# Altium footprint library PowerProducts.PCBLIB: 166 footprints (part 10 of 11)
Each footprint in its own frame and in the unit in brackets; x right, y up, seen from the top. Pads: shape width x height; smd on the part's side, far side on the other; paste and mask are expansions set on the pad; w line width, h text height; cw(c..) or ccw(c..) is an arc to the next point about the centre after c.
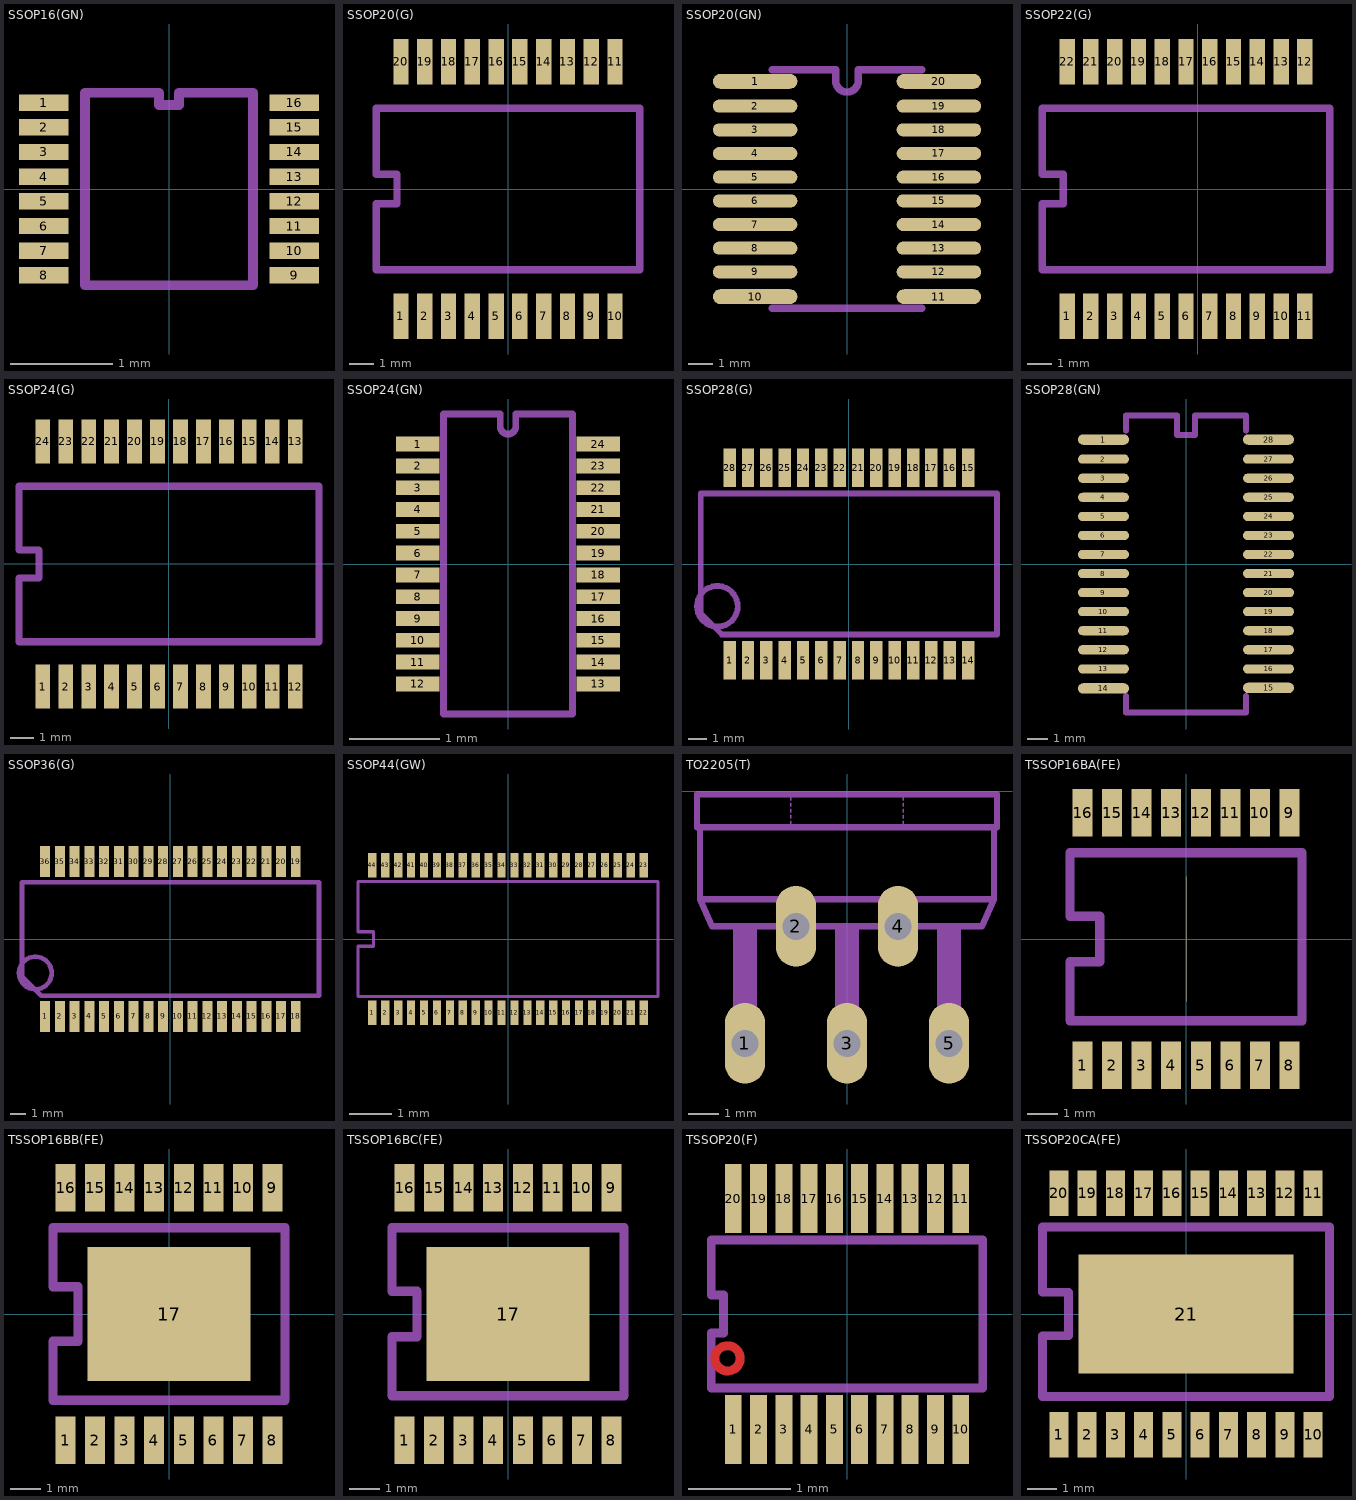
[diagram p9: the footprints below, top view; thin cyan lines are the x and y axes]

## SSOP16(GN) [mil]
pads (16):
  rect 19.05x6.29 smd: 1(-48.39,33.34) 2(-48.39,23.81) 3(-48.39,14.29) 4(-48.39,4.76) 5(-48.39,-4.76) 6(-48.39,-14.29) 7(-48.39,-23.81) 8(-48.39,-33.34) 9(48.39,-33.34) 10(48.39,-23.81) 11(48.39,-14.29) 12(48.39,-4.76) 13(48.39,4.76) 14(48.39,14.29) 15(48.39,23.81) 16(48.39,33.34)
Mechanical 2:
  lines w3.81: -32.38,-37.15 32.38,-37.15 32.38,37.15 3.91,37.15 3.91,32.5 -3.91,32.5 -3.91,37.15 -32.38,37.15 -32.38,-37.15

## SSOP20(G) [mil]
pads (20):
  rect 24.8x73.82 smd: 1(-172.74,-205.22) 2(-134.35,-205.22) 3(-95.96,-205.22) 4(-57.58,-205.22) 5(-19.19,-205.22) 6(19.19,-205.22) 7(57.58,-205.22) 8(95.96,-205.22) 9(134.35,-205.22) 10(172.74,-205.22) 11(172.74,205.22) 12(134.35,205.22) 13(95.96,205.22) 14(57.58,205.22) 15(19.19,205.22) 16(-19.19,205.22) 17(-57.58,205.22) 18(-95.96,205.22) 19(-134.35,205.22) 20(-172.74,205.22)
Mechanical 2:
  lines w12: -212.6,-130.22 -212.6,-23.62 -179.16,-23.62 -179.16,23.62 -212.6,23.62 -212.6,130.22 212.6,130.22 212.6,-130.22 -212.6,-130.22

## SSOP20(GN) [mm]
pads (20):
  rrect100% 3.405x0.6 smd: 1(-3.696,4.331) 10(-3.696,-4.331) 11(3.696,-4.331) 20(3.696,4.331)
  rrect100% 3.405x0.525 smd: 2(-3.696,3.334) 3(-3.696,2.381) 4(-3.696,1.429) 5(-3.696,0.476) 6(-3.696,-0.476) 7(-3.696,-1.429) 8(-3.696,-2.381) 9(-3.696,-3.334) 12(3.696,-3.334) 13(3.696,-2.381) 14(3.696,-1.429) 15(3.696,-0.476) 16(3.696,0.476) 17(3.696,1.429) 18(3.696,2.381) 19(3.696,3.334)
Mechanical 2:
  lines w0.3: -3,-4.8 3,-4.8 ; -3,4.8 -0.45,4.8 -0.45,4.35 ccw(c0,4.35) 0.45,4.35 0.45,4.8 3,4.8

## SSOP22(G) [mil]
pads (22):
  rect 24.8x73.82 smd: 1(-211.12,-205.22) 2(-172.74,-205.22) 3(-134.35,-205.22) 4(-95.96,-205.22) 5(-57.58,-205.22) 6(-19.19,-205.22) 7(19.19,-205.22) 8(57.58,-205.22) 9(95.96,-205.22) 10(134.35,-205.22) 11(172.74,-205.22) 12(172.74,205.22) 13(134.35,205.22) 14(95.96,205.22) 15(57.58,205.22) 16(19.19,205.22) 17(-19.19,205.22) 18(-57.58,205.22) 19(-95.96,205.22) 20(-134.35,205.22) 21(-172.74,205.22) 22(-211.12,205.22)
Mechanical 2:
  lines w12: -250.98,-130.22 -250.98,-23.62 -217.54,-23.62 -217.54,23.62 -250.98,23.62 -250.98,130.22 212.6,130.22 212.6,-130.22 -250.98,-130.22

## SSOP24(G) [mil]
pads (24):
  rect 24.8x73.82 smd: 1(-211.12,-205.22) 2(-172.74,-205.22) 3(-134.35,-205.22) 4(-95.96,-205.22) 5(-57.58,-205.22) 6(-19.19,-205.22) 7(19.19,-205.22) 8(57.58,-205.22) 9(95.96,-205.22) 10(134.35,-205.22) 11(172.74,-205.22) 12(211.12,-205.22) 13(211.12,205.22) 14(172.74,205.22) 15(134.35,205.22) 16(95.96,205.22) 17(57.58,205.22) 18(19.19,205.22) 19(-19.19,205.22) 20(-57.58,205.22) 21(-95.96,205.22) 22(-134.35,205.22) 23(-172.74,205.22) 24(-211.12,205.22)
Mechanical 2:
  lines w12: -250.98,-130.22 -250.98,-23.62 -217.54,-23.62 -217.54,23.62 -250.98,23.62 -250.98,130.22 250.98,130.22 250.98,-130.22 -250.98,-130.22

## SSOP24(GN) [mil]
pads (24):
  rect 19.05x6.48 smd: 1(-39.43,52.39) 2(-39.43,42.86) 3(-39.43,33.34) 4(-39.43,23.81) 5(-39.43,14.29) 6(-39.43,4.76) 7(-39.43,-4.76) 8(-39.43,-14.29) 9(-39.43,-23.81) 10(-39.43,-33.34) 11(-39.43,-42.86) 12(-39.43,-52.39) 13(39.43,-52.39) 14(39.43,-42.86) 15(39.43,-33.34) 16(39.43,-23.81) 17(39.43,-14.29) 18(39.43,-4.76) 19(39.43,4.76) 20(39.43,14.29) 21(39.43,23.81) 22(39.43,33.34) 23(39.43,42.86) 24(39.43,52.39)
Mechanical 2:
  lines w3: -28.19,-65.53 28.19,-65.53 28.19,65.53 3.41,65.53 3.41,60.28 cw(c0,60.17) -3.41,60.28 -3.41,65.53 -28.19,65.53 -28.19,-65.53

## SSOP28(G) [mil]
pads (28):
  rect 25.98x80.91 smd: 1(-249.51,-201.67) 2(-211.12,-201.67) 3(-172.74,-201.67) 4(-134.35,-201.67) 5(-95.96,-201.67) 6(-57.58,-201.67) 7(-19.19,-201.67) 8(19.19,-201.67) 9(57.58,-201.67) 10(95.96,-201.67) 11(134.35,-201.67) 12(172.74,-201.67) 13(211.12,-201.67) 14(249.51,-201.67) 15(249.51,201.67) 16(211.12,201.67) 17(172.74,201.67) 18(134.35,201.67) 19(95.96,201.67) 20(57.58,201.67) 21(19.19,201.67) 22(-19.19,201.67) 23(-57.58,201.67) 24(-95.96,201.67) 25(-134.35,201.67) 26(-172.74,201.67) 27(-211.12,201.67) 28(-249.51,201.67)
Mechanical 2:
  circle w12: c-275.23,-88.58 r42.59
  lines w12: -310.04,-103.35 -310.04,147.64 310.04,147.64 310.04,-147.64 -265.75,-147.64 -310.04,-103.35

## SSOP28(GN) [mm]
pads (28):
  rrect100% 2.55x0.525 smd: 1(-4.123,6.221) 14(-4.123,-6.221) 15(4.123,-6.191) 28(4.123,6.221)
  rrect100% 2.55x0.457 smd: 2(-4.123,5.239) 3(-4.123,4.286) 4(-4.123,3.334) 5(-4.123,2.381) 6(-4.123,1.429) 7(-4.123,0.476) 8(-4.123,-0.476) 9(-4.123,-1.429) 10(-4.123,-2.381) 11(-4.123,-3.334) 12(-4.123,-4.286) 13(-4.123,-5.239) 16(4.123,-5.239) 17(4.123,-4.286) 18(4.123,-3.334) 19(4.123,-2.381) 20(4.123,-1.429) 21(4.123,-0.476) 22(4.123,0.476) 23(4.123,1.429) 24(4.123,2.381) 25(4.123,3.334) 26(4.123,4.286) 27(4.123,5.239)
Mechanical 2:
  lines w0.3: -3,-6.6 -3,-7.425 3,-7.425 3,-6.6 ; -3,6.675 -3,7.425 -0.45,7.425 -0.45,6.45 0.45,6.45 0.45,7.425 3,7.425 3,6.675

## SSOP36(G) [mil]
pads (36):
  rect 25.98x80.91 smd: 1(-326.28,-201.67) 2(-287.89,-201.67) 3(-249.51,-201.67) 4(-211.12,-201.67) 5(-172.74,-201.67) 6(-134.35,-201.67) 7(-95.96,-201.67) 8(-57.58,-201.67) 9(-19.19,-201.67) 10(19.19,-201.67) 11(57.58,-201.67) 12(95.96,-201.67) 13(134.35,-201.67) 14(172.74,-201.67) 15(211.12,-201.67) 16(249.51,-201.67) 17(287.89,-201.67) 18(326.28,-201.67) 19(326.28,201.67) 20(287.89,201.67) 21(249.51,201.67) 22(211.12,201.67) 23(172.74,201.67) 24(134.35,201.67) 25(95.96,201.67) 26(57.58,201.67) 27(19.19,201.67) 28(-19.19,201.67) 29(-57.58,201.67) 30(-95.96,201.67) 31(-134.35,201.67) 32(-172.74,201.67) 33(-211.12,201.67) 34(-249.51,201.67) 35(-287.89,201.67) 36(-326.28,201.67)
Mechanical 2:
  circle w12: c-352,-88.58 r42.59
  lines w12: -386.81,-97.44 -386.81,147.64 386.81,147.64 386.81,-147.64 -336.61,-147.64 -386.81,-97.44

## SSOP44(GW) [mil]
pads (44):
  rect 7.62x22.86 smd: 1(-126.02,-68.58) 2(-114.01,-68.58) 3(-102.01,-68.58) 4(-90.01,-68.58) 5(-78.01,-68.58) 6(-66.01,-68.58) 7(-54.01,-68.58) 8(-42.01,-68.58) 9(-30,-68.58) 10(-18,-68.58) 11(-6,-68.58) 12(6,-68.58) 13(18,-68.58) 14(30,-68.58) 15(42.01,-68.58) 16(54.01,-68.58) 17(66.01,-68.58) 18(78.01,-68.58) 19(90.01,-68.58) 20(102.01,-68.58) 21(114.01,-68.58) 22(126.02,-68.58) 23(126.02,68.58) 24(114.01,68.58) 25(102.01,68.58) 26(90.01,68.58) 27(78.01,68.58) 28(66.01,68.58) 29(54.01,68.58) 30(42.01,68.58) 31(30,68.58) 32(18,68.58) 33(6,68.58) 34(-6,68.58) 35(-18,68.58) 36(-30,68.58) 37(-42.01,68.58) 38(-54.01,68.58) 39(-66.01,68.58) 40(-78.01,68.58) 41(-90.01,68.58) 42(-102.01,68.58) 43(-114.01,68.58) 44(-126.02,68.58)
Mechanical 2:
  lines w3.05: -139.35,-53.34 -139.35,-6.67 -124.93,-6.67 -124.93,6.67 -139.35,6.67 -139.35,53.34 139.35,53.34 139.35,-53.34 -139.35,-53.34

## TO2205(T) [mil]
pads (5):
  oval 53.15x106.29 hole 35.43: 1(-133.86,-330.71) 2(-66.93,-177.17) 3(0,-330.71) 4(66.93,-177.17) 5(133.86,-330.71)
Mechanical 2:
  lines w8: -196.85,-47.24 -196.85,-3.94 196.85,-3.94 196.85,-47.24 -196.85,-47.24
Mechanical 18:
  rectangle: -149.61,-338.58 -118.11,-295.28
  rectangle: -15.75,-338.58 15.75,-295.28
  rectangle: 118.11,-338.58 149.61,-295.28
  rectangle: -149.61,-295.28 -118.11,-177.17
  rectangle: -15.75,-295.28 15.75,-177.17
  rectangle: 118.11,-295.28 149.61,-177.17
  rectangle: -82.68,-185.04 -51.18,-177.17
  rectangle: 51.18,-185.04 82.68,-177.17
  lines w2: -73.62,-46.06 -73.62,-39.37 ; -73.62,-35.43 -73.62,-31.5 ; -73.62,-27.56 -73.62,-23.62 ; -73.62,-19.69 -73.62,-15.75 ; -73.62,-11.81 -73.62,-7.87 ; 73.62,-46.06 73.62,-39.37 ; 73.62,-35.43 73.62,-31.5 ; 73.62,-27.56 73.62,-23.62 ; 73.62,-19.69 73.62,-15.75 ; 73.62,-11.81 73.62,-7.87
  lines w8: -192.91,-47.24 -192.91,-141.73 ; 192.91,-47.24 192.91,-141.73 ; -192.91,-141.73 -177.17,-177.17 177.17,-177.17 192.91,-141.73 ; -192.91,-141.73 192.91,-141.73

## TSSOP16BA(FE) [mil]
pads (17):
  rect 25.98x62.01 smd: 1(-134.35,-163.88) 2(-95.96,-163.88) 3(-57.58,-163.88) 4(-19.19,-163.88) 5(19.19,-163.88) 6(57.58,-163.88) 7(95.96,-163.88) 8(134.35,-163.88) 9(134.35,163.88) 10(95.96,163.88) 11(57.58,163.88) 12(19.19,163.88) 13(-19.19,163.88) 14(-57.58,163.88) 15(-95.96,163.88) 16(-134.35,163.88)
  rect 0x161.81 smd: 17(0,0)
Mechanical 2:
  lines w12: -150.59,-106.3 150.59,-106.3 150.59,112.2 -150.59,112.2 -150.59,29.53 -112.2,29.53 -112.2,-29.53 -150.59,-29.53 -150.59,-106.3

## TSSOP16BB(FE) [mil]
pads (17):
  rect 25.98x62.01 smd: 1(-134.35,-163.88) 2(-95.96,-163.88) 3(-57.58,-163.88) 4(-19.19,-163.88) 5(19.19,-163.88) 6(57.58,-163.88) 7(95.96,-163.88) 8(134.35,-163.88) 9(134.35,163.88) 10(95.96,163.88) 11(57.58,163.88) 12(19.19,163.88) 13(-19.19,163.88) 14(-57.58,163.88) 15(-95.96,163.88) 16(-134.35,163.88)
  rect 211.42x174.21 smd: 17(0,0)
Mechanical 2:
  lines w12: -150.59,-112.2 150.59,-112.2 150.59,112.2 -150.59,112.2 -150.59,35.43 -118.11,35.43 -118.11,-35.43 -150.59,-35.43 -150.59,-112.2

## TSSOP16BC(FE) [mil]
pads (17):
  rect 25.98x62.01 smd: 1(-134.35,-163.88) 2(-95.96,-163.88) 3(-57.58,-163.88) 4(-19.19,-163.88) 5(19.19,-163.88) 6(57.58,-163.88) 7(95.96,-163.88) 8(134.35,-163.88) 9(134.35,163.88) 10(95.96,163.88) 11(57.58,163.88) 12(19.19,163.88) 13(-19.19,163.88) 14(-57.58,163.88) 15(-95.96,163.88) 16(-134.35,163.88)
  rect 211.42x173.62 smd: 17(0,0)
Mechanical 2:
  lines w12: -150.59,-106.3 150.59,-106.3 150.59,112.2 -150.59,112.2 -150.59,29.53 -118.11,29.53 -118.11,-29.53 -150.59,-29.53 -150.59,-106.3

## TSSOP20(F) [mil]
pads (20):
  rect 6.48x26.67 smd: 1(-43.86,-44.55) 2(-34.11,-44.55) 3(-24.36,-44.55) 4(-14.62,-44.55) 5(-4.87,-44.55) 6(4.87,-44.55) 7(14.62,-44.55) 8(24.36,-44.55) 9(34.11,-44.55) 10(43.86,-44.55) 11(43.86,44.55) 12(34.11,44.55) 13(24.36,44.55) 14(14.62,44.55) 15(4.87,44.55) 16(-4.87,44.55) 17(-14.62,44.55) 18(-24.36,44.55) 19(-34.11,44.55) 20(-43.86,44.55)
Top Layer:
  circle w3.43: c-46.1,-17.13 r4.88
Mechanical 2:
  lines w3.43: -52.39,-28.58 52.39,-28.58 52.39,28.58 -52.39,28.58 -52.39,7.32 -47.63,7.32 -47.63,-7.32 -52.39,-7.32 -52.39,-28.58

## TSSOP20CA(FE) [mil]
pads (21):
  rect 25.98x62.01 smd: 1(-172.74,-163.88) 2(-134.35,-163.88) 3(-95.96,-163.88) 4(-57.58,-163.88) 5(-19.19,-163.88) 6(19.19,-163.88) 7(57.58,-163.88) 8(95.96,-163.88) 9(134.35,-163.88) 10(172.74,-163.88) 11(172.74,163.88) 12(134.35,163.88) 13(95.96,163.88) 14(57.58,163.88) 15(19.19,163.88) 16(-19.19,163.88) 17(-57.58,163.88) 18(-95.96,163.88) 19(-134.35,163.88) 20(-172.74,163.88)
  rect 292.32x161.81 smd: 21(0,0)
Mechanical 2:
  lines w12: -194.88,-112.2 194.88,-112.2 194.88,118.11 -194.88,118.11 -194.88,29.53 -159.45,29.53 -159.45,-29.53 -194.88,-29.53 -194.88,-112.2